# Altium footprint library TomvanRijn-PCB.PcbLib: 165 footprints (part 9 of 11)
Each footprint in its own frame and in the unit in brackets; x right, y up, seen from the top. Pads: shape width x height; smd on the part's side, far side on the other; paste and mask are expansions set on the pad; w line width, h text height; cw(c..) or ccw(c..) is an arc to the next point about the centre after c.
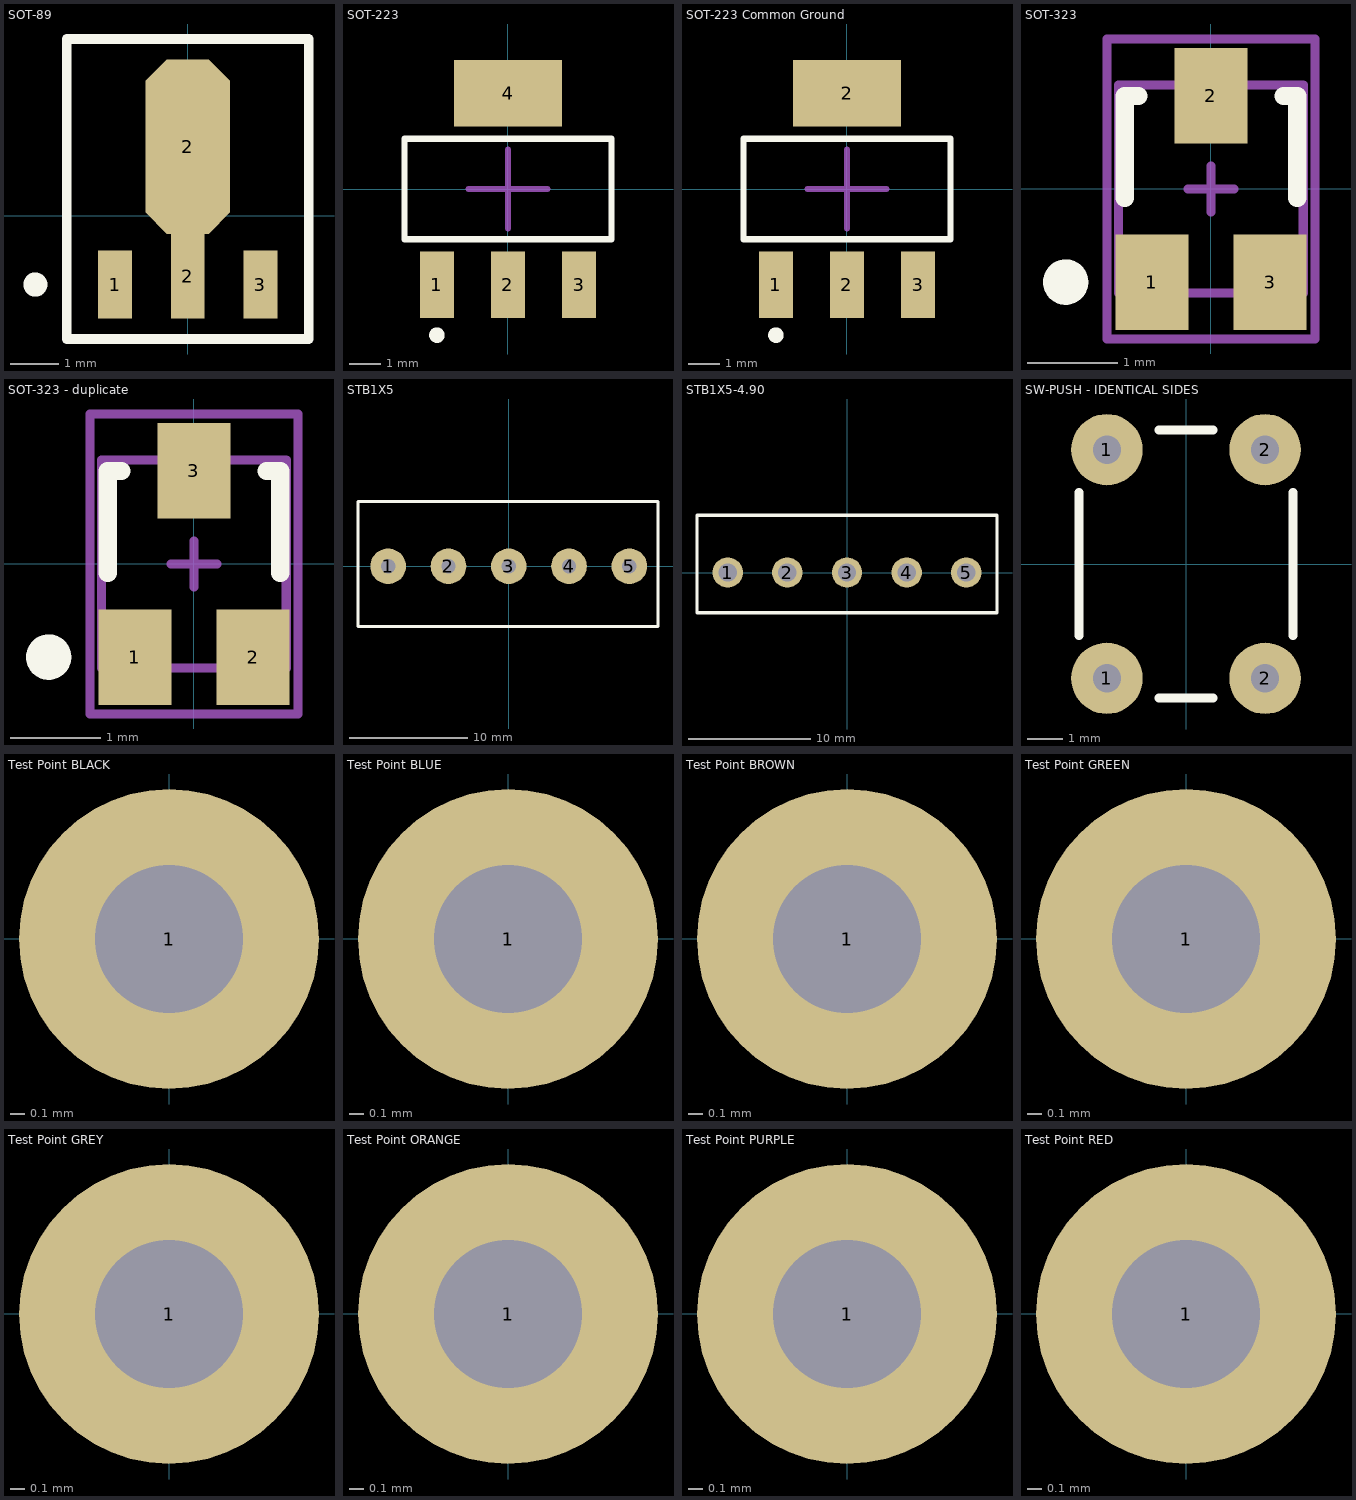
[diagram p8: the footprints below, top view; thin cyan lines are the x and y axes]

## SOT-89 [mm] "SOT-89; Body 4.7 x 4.5 mm, inc. leads (LxW max)"
height 1.7
pads (4):
  rect 0.7x1.4 smd: 1(-1.5,-1.425) 3(1.5,-1.425)
  rect 0.7x1.75 smd: 2(0,-1.25)
  oct 1.75x3.6 smd: 2(0,1.425)
Top Overlay:
  circle w0.25: c-3.15,-1.425 r0.125
  lines w0.2: -2.5,-2.55 -2.5,3.65 2.5,3.65 2.5,-2.55 -2.5,-2.55
3D body "SOT-89.step": height 1.51, standoff 0, extent -2.25,-1.6 2.25,2.7

## SOT-223 [mm] "SOT-223/SC-73; 4 Leads; Body 6.7 x 7.3 mm, inc. leads (LxW max)"
height 1.8
pads (4):
  rect 1.1x2.15 smd: 1(-2.3,-3.1) 2(0,-3.1) 3(2.3,-3.1)
  rect 3.5x2.15 smd: 4(0,3.1)
Top Overlay:
  circle w0.25: c-2.3,-4.725 r0.125
  lines w0.2: -3.35,-1.625 -3.35,1.625 3.35,1.625 3.35,-1.625 -3.35,-1.625
Mechanical 15:
  lines w0.203: -1.27,0 1.27,0 ; 0,-1.27 0,1.27
3D body "SOT-223.step": height 1.86, standoff -0.04, extent -3.321,-3.674 3.379,3.53

## SOT-223 Common Ground [mm] "SOT-223/SC-73; 4 Leads; Body 6.7 x 7.3 mm, inc. leads (LxW max)"
height 1.8
pads (4):
  rect 1.1x2.15 smd: 1(-2.3,-3.1) 2(0,-3.1) 3(2.3,-3.1)
  rect 3.5x2.15 smd: 2(0,3.1)
Top Overlay:
  circle w0.25: c-2.3,-4.725 r0.125
  lines w0.2: -3.35,-1.625 3.35,-1.625 3.35,1.625 -3.35,1.625 -3.35,-1.625
Mechanical 15:
  lines w0.203: -1.27,0 1.27,0 ; 0,-1.27 0,1.27
3D body "SOT-223.step": height 1.86, standoff -0.04, extent -3.321,-3.674 3.379,3.53

## SOT-323 [mm] "SOT-323/SC-70; 3 Leads; Body 2.2 x 2.2 mm, inc. leads (LxW max)"
height 1
pads (3):
  rect 0.8x1.05 smd: 1(-0.65,-1.025) 2(0,1.025) 3(0.65,-1.025)
Top Overlay:
  circle w0.25: c-1.6,-1.025 r0.125
  lines w0.2: -0.95,-0.1 -0.95,1.025 -0.8,1.025 ; 0.8,1.025 0.95,1.025 0.95,-0.1
Mechanical 13:
  lines w0.1: -1.016,-1.143 -1.016,1.143 1.016,1.143 1.016,-1.143 -1.016,-1.143
Mechanical 15:
  lines w0.1: -0.254,0 0.254,0 ; 0,-0.254 0,0.254 ; -1.143,-1.651 -1.143,1.651 1.143,1.651 1.143,-1.651 -1.143,-1.651
3D body "SOT-323.step": height 1, standoff 0, extent -1.05,-1.15 1.05,1.15

## SOT-323 - duplicate [mm] "SOT-323/SC-70; 3 Leads; Body 2.2 x 2.2 mm, inc. leads (LxW max)"
height 1
pads (3):
  rect 0.8x1.05 smd: 1(-0.65,-1.025) 2(0.65,-1.025) 3(0,1.025)
Top Overlay:
  circle w0.25: c-1.6,-1.025 r0.125
  lines w0.2: -0.95,-0.1 -0.95,1.025 -0.8,1.025 ; 0.8,1.025 0.95,1.025 0.95,-0.1
Mechanical 13:
  lines w0.1: -1.016,-1.143 1.016,-1.143 1.016,1.143 -1.016,1.143 -1.016,-1.143
Mechanical 15:
  lines w0.1: -0.254,0 0.254,0 ; 0,-0.254 0,0.254 ; -1.143,-1.651 1.143,-1.651 1.143,1.651 -1.143,1.651 -1.143,-1.651
3D body "SOT-323.step": height 1, standoff 0, extent -1.05,-1.15 1.05,1.15

## STB1X5 [mm] "Screw Terminal Block, 1 row 5 way, 5.08 mm pitch"
height 10
pads (5):
  round 3 hole 1.2: 1(-10.16,0) 2(-5.08,0) 3(0,0) 4(5.08,0) 5(10.16,0)
Top Overlay:
  lines w0.254: -12.7,-5.08 12.573,-5.08 12.573,5.461 -12.7,5.461 -12.7,-5.08
3D body "User Library-klema-5mm-2pin.step": height 14, standoff -4, extent -12.667,-5.039 -2.667,5.461
3D body "User Library-klema-5mm-3pin.step": height 14, standoff -4, extent -2.413,-5.039 12.587,5.461

## STB1X5-4.90 [mm] "Screw block, 5 way, 4.90 mm pitch"
height 10
pads (5):
  round 2.5 hole 1.5: 1(-9.8,0) 2(-4.9,0) 3(0,0) 4(4.9,0) 5(9.8,0)
Top Overlay:
  lines w0.254: -12.319,-3.302 -12.319,4.699 12.319,4.699 12.319,-3.302 -12.319,-3.302
3D body "HDR2-x.step": height 10, standoff -3.5, extent -12.366,-3.301 -2.366,4.699
3D body "HDR2-x.step": height 10, standoff -3.5, extent -7.54,-3.301 2.46,4.699
3D body "HDR2-x.step": height 10, standoff -3.5, extent 2.366,-3.301 12.366,4.699

## SW-PUSH - IDENTICAL SIDES [mm] "Switch, push button, tacticle, 6 x 4 mm"
height 4
pads (4):
  round 2.032 hole 0.8: 1(-2.25,-3.25) 1(-2.25,3.25) 2(2.25,-3.25) 2(2.25,3.25)
Top Overlay:
  lines w0.254: -3.048,-2.032 -3.048,2.032 ; -0.762,-3.81 0.762,-3.81 ; -0.762,3.81 0.762,3.81 ; 3.048,-2.032 3.048,2.032
3D body "User Library-Tactile switch 6x6x5mm.step": height 5.01, standoff -3.51, extent -3.015,-3.871 3.015,3.872

## Test Point BLACK [mil] "Test Point Keystone BLACK 5001"
pads (1):
  round 80 hole 39.37: 1(0,0)
3D body "User Library-TEST POINT BLK Keystone 5001.step": height 192.34, standoff -121.02, extent -50,-50 50,50

## Test Point BLUE [mil] "Test Point Keystone BLUE 5117"
pads (1):
  round 80 hole 39.37: 1(0,0)
3D body "User Library-TEST POINT BLU Keystone 5117.step": height 192.34, standoff -121.02, extent -50,-50 50,50

## Test Point BROWN [mil] "Test Point Keystone BROWN 5115"
pads (1):
  round 80 hole 39.37: 1(0,0)
3D body "User Library-TEST POINT BRN Keystone 5115.step": height 192.34, standoff -121.02, extent -50,-50 50,50

## Test Point GREEN [mil] "Test Point Keystone GREEN 5116"
pads (1):
  round 80 hole 39.37: 1(0,0)
3D body "User Library-TEST POINT GRN Keystone 5116.step": height 192.34, standoff -121.02, extent -50,-50 50,50

## Test Point GREY [mil] "Test Point Keystone GREY 5118"
pads (1):
  round 80 hole 39.37: 1(0,0)
3D body "User Library-TEST POINT GRY Keystone 5118.step": height 192.34, standoff -121.02, extent -50,-50 50,50

## Test Point ORANGE [mil] "Test Point Keystone ORANGE 5003"
pads (1):
  round 80 hole 39.37: 1(0,0)
3D body "User Library-TEST POINT ORN Keystone 5003.step": height 192.34, standoff -121.02, extent -50,-50 50,50

## Test Point PURPLE [mil] "Test Point Keystone PURPLE 5119"
pads (1):
  round 80 hole 39.37: 1(0,0)
3D body "User Library-TEST POINT VIO Keystone 5119.step": height 192.34, standoff -121.02, extent -50,-50 50,50

## Test Point RED [mil] "Test Point Keystone RED 5000"
pads (1):
  round 80 hole 39.37: 1(0,0)
3D body "User Library-TEST POINT RED Keystone 5000.step": height 192.34, standoff -121.02, extent -50,-50 50,50